# Altium footprint library mmyLibrary.PcbLib: 231 footprints (part 12 of 15)
Each footprint in its own frame and in the unit in brackets; x right, y up, seen from the top. Pads: shape width x height; smd on the part's side, far side on the other; paste and mask are expansions set on the pad; w line width, h text height; cw(c..) or ccw(c..) is an arc to the next point about the centre after c.
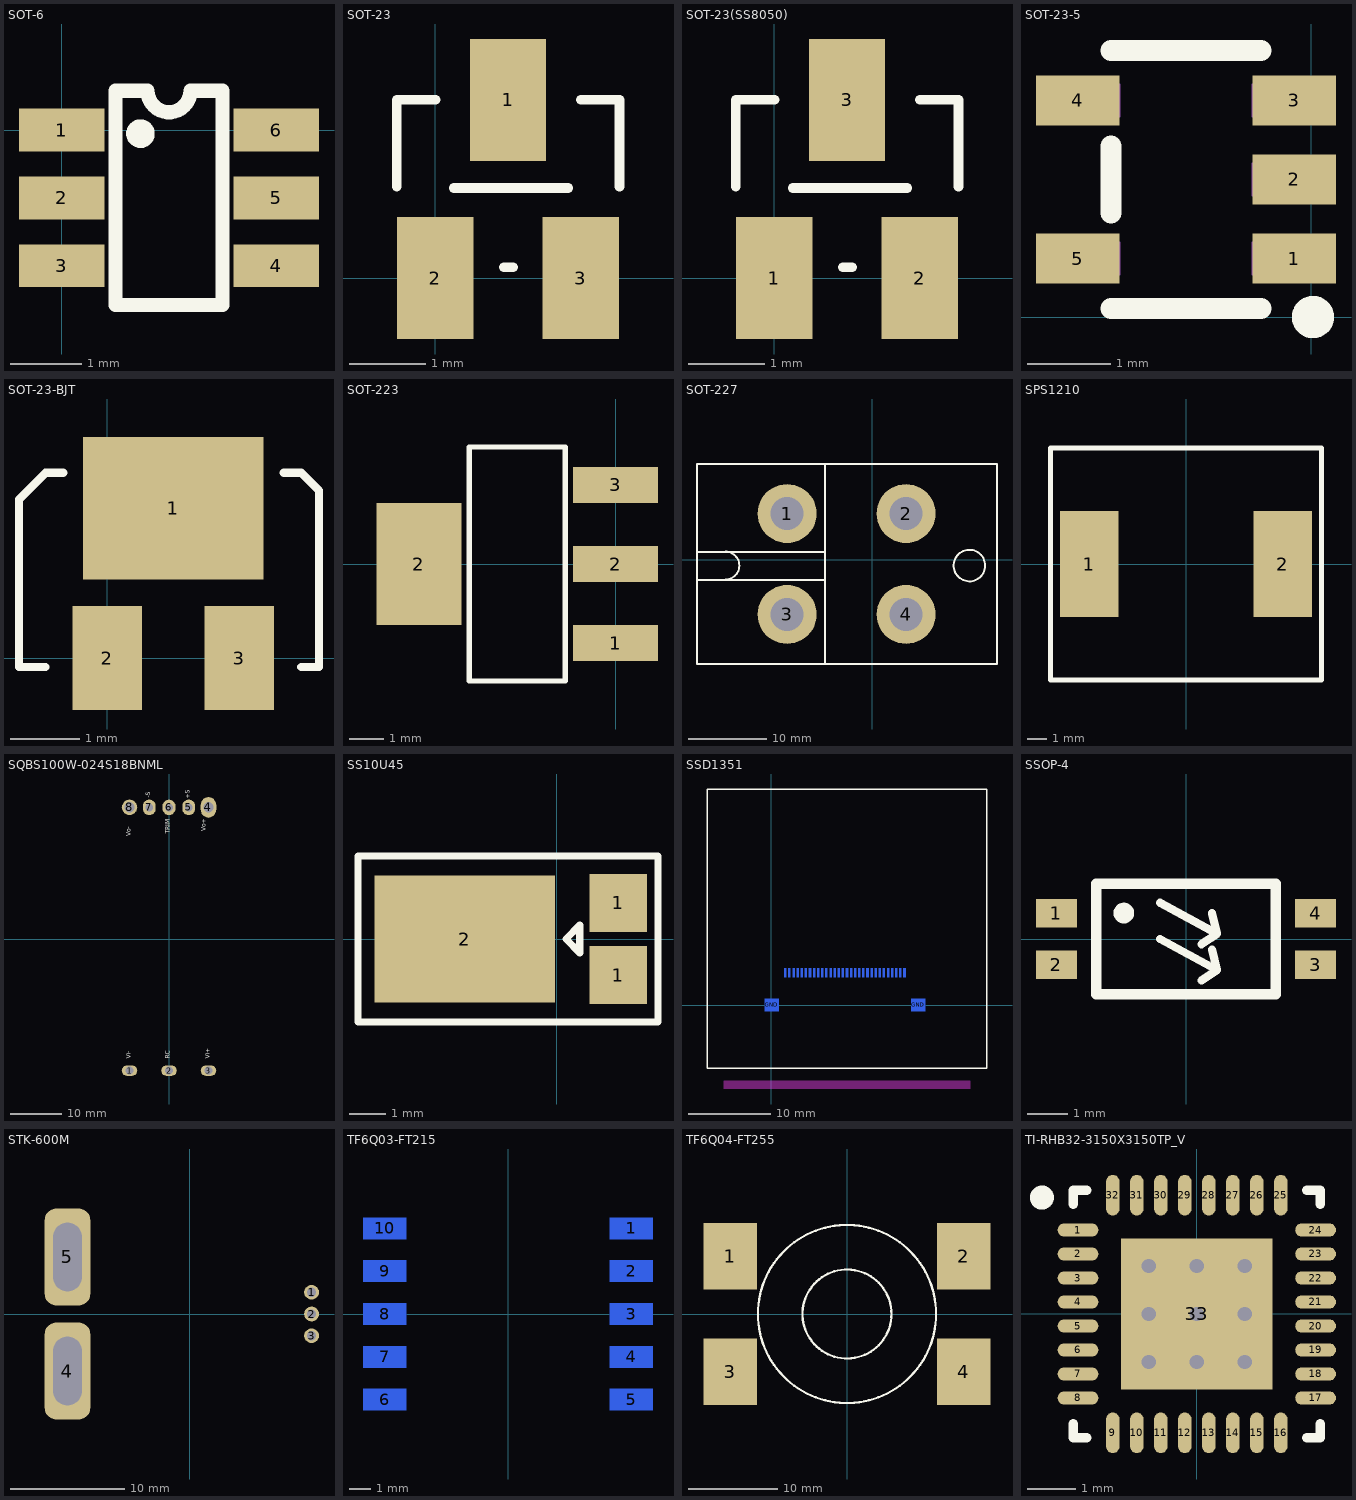
[diagram p11: the footprints below, top view; thin cyan lines are the x and y axes]

## SOT-6 [mm]
pads (6):
  rect 1.2x0.6 smd: 1(0,0) 2(0,-0.95) 3(0,-1.9) 4(3,-1.9) 5(3,-0.95) 6(3,0)
Top Overlay:
  circle w0.2: c1.1,-0.05 r0.1
  lines w0.2: 0.75,-2.45 0.75,0.55 1.2,0.55 ccw(c1.5,0.55) 1.8,0.55 2.25,0.55 2.25,-2.45 0.75,-2.45

## SOT-23 [mm] "MMSS8050"
pads (3):
  rect 1x1.6 smd: 1(0.955,2.335) 2(0,0) 3(1.91,0)
Top Overlay:
  lines w0.127: -0.503,1.196 -0.503,2.339 0.005,2.339 ; 0.245,1.18 1.745,1.18 ; 0.898,0.14 1.025,0.14 ; 1.91,2.339 2.418,2.339 2.418,1.196
3D body "ALSRobot-SOT23.STEP": height 1.08, standoff 0, extent -0.582,-0.124 2.418,2.516

## SOT-23(SS8050) [mm]
pads (3):
  rect 1x1.6 smd: 1(0,0) 2(1.91,0) 3(0.955,2.335)
Top Overlay:
  lines w0.127: -0.503,1.196 -0.503,2.339 0.005,2.339 ; 0.245,1.18 1.745,1.18 ; 0.898,0.14 1.025,0.14 ; 1.91,2.339 2.418,2.339 2.418,1.196
3D body "ALSRobot-SOT23.STEP": height 1.08, standoff 0, extent -0.505,-0.14 2.495,2.5

## SOT-23-5 [mm]
pads (5):
  rect 1x0.6 smd mask+0.051: 1(-0.202,0.701) 2(-0.202,1.651) 3(-0.202,2.601) 4(-2.802,2.601) 5(-2.802,0.701)
Top Overlay:
  circle w0.254: c0.022,0 r0.127
  lines w0.254: -2.402,0.101 -0.602,0.101 ; -2.402,1.251 -2.402,2.051 ; -2.402,3.201 -0.602,3.201
Mechanical 15:
  region: -0.712,0.501 -0.712,0.901 -0.542,0.901 -0.542,0.501
  region: -0.552,0.501 -0.552,0.901 -0.102,0.901 -0.102,0.501
  region: -0.712,1.451 -0.712,1.851 -0.542,1.851 -0.542,1.451
  region: -0.552,1.451 -0.552,1.851 -0.102,1.851 -0.102,1.451
  region: -0.712,2.401 -0.712,2.801 -0.542,2.801 -0.542,2.401
  region: -0.552,2.401 -0.552,2.801 -0.102,2.801 -0.102,2.401
  region: -2.462,2.401 -2.462,2.801 -2.292,2.801 -2.292,2.401
  region: -2.902,2.401 -2.902,2.801 -2.452,2.801 -2.452,2.401
  region: -2.462,0.501 -2.462,0.901 -2.292,0.901 -2.292,0.501
  region: -2.902,0.501 -2.902,0.901 -2.452,0.901 -2.452,0.501
  lines w0.051: -2.302,0.201 -0.702,0.201 ; -2.302,3.101 -0.702,3.101
3D body "CircuitWorks-SOT-23-5.STEP": height 1.15, standoff 0.05, extent -2.774,0.151 -0.274,3.151

## SOT-23-BJT [mm]
pads (3):
  rect 2.6x2.05 smd: 1(0.95,2.159)
  rect 1x1.5 smd: 2(0,0) 3(1.9,0)
Top Overlay:
  lines w0.12: -0.889,-0.127 -1.27,-0.127 -1.27,2.286 -0.889,2.667 -0.635,2.667 ; 2.54,2.667 2.794,2.667 3.048,2.413 3.048,-0.127 2.794,-0.127

## SOT-223 [mm]
pads (4):
  rect 2.465x1.05 smd: 1(0,-2.3) 2(0,0) 3(0,2.3)
  rect 2.465x3.54 smd: 2(-5.715,0)
Top Overlay:
  lines w0.152: -4.254,-3.401 -4.254,3.401 -1.461,3.401 -1.461,-3.401 -4.254,-3.401
3D body "CircuitWorks-SOT-223.STEP": height 1.8, standoff 0.12, extent -6.274,-3.25 0.686,3.25

## SOT-227 [mm]
pads (4):
  round 7.5 hole 4.2: 1(-10.785,5.871) 2(4.315,5.871) 3(-10.785,-6.929) 4(4.315,-6.929)
Top Overlay:
  circle w0.254: c12.365,-0.729 r2
  lines w0.254: -22.235,-2.561 -5.979,-2.561 ; -22.235,0.995 -5.979,0.995 ; -18.635,-2.507 ccw(c-18.635,-0.729) -18.635,1.049 ; -5.979,-13.211 -5.979,-2.561 ; -5.979,12.153 -5.979,0.995 ; -5.979,-2.561 -5.979,0.995 ; -22.235,-13.229 15.865,-13.229 15.865,12.171 -22.235,12.171 -22.235,-13.229

## SPS1210 [mm]
pads (2):
  rect 3x5.5 smd: 1(-5,0) 2(5,0)
Top Overlay:
  lines w0.254: -7,-6 -7,6 7,6 7,-6 -7,-6

## SQBS100W-024S18BNML [mm] "57.9mm 36.8mm"
pads (8):
  oval 3x2 hole 1.5: 1(-7.62,-25.4) 2(0,-25.4) 3(7.62,-25.4)
  oval 3x4 hole 2: 4(7.62,25.4)
  oval 2.5x3 hole 1.5: 5(3.81,25.4) 6(0,25.4) 7(-3.81,25.4)
  round 3 hole 2: 8(-7.62,25.4)
Top Overlay:
  text "TRIM" at 0.469,20.306 h1.5
  text "-S" at -3.331,27.214 h1.5
  text "+S" at 4.269,27.058 h1.5
  text "Vo+" at 7.369,20.753 h1.5
  text "Vo-" at -7.12,19.806 h1.5
  text "Vi-" at -7.12,-23.1 h1.5
  text "RC" at 0.48,-23.101 h1.5
  text "Vi+" at 8.18,-23.1 h1.5
Bottom Overlay:
  circle w0.2: c-13.08,-23.6 r1.6
  circle w0.2: c13.08,-23.6 r1.6
  circle w0.2: c13.08,23.6 r1.6
  circle w0.2: c-13.08,23.6 r1.6
  lines w0.2: -18.4,-28.95 18.4,-28.95 18.4,28.95 -18.4,28.95 -18.4,-28.95
  text "Vi+" at 8.18,-21.205 h1.5
  text "RC" at 0.48,-21.322 h1.5
  text "Vi-" at -7.12,-21.51 h1.5
  text "Vo-" at -7.12,21.844 h1.5
  text "Vo+" at 8.18,21.844 h1.5
  text "+S" at 4.18,21.846 h1.5
  text "-S" at -3.32,21.846 h1.5
  text "TRIM" at 0.496,21.846 h1.5

## SS10U45 [mm] "diode"
pads (3):
  rect 1.6x1.6 smd: 1(1.7,-1) 1(1.7,1)
  rect 5x3.5 smd: 2(-2.55,0)
Top Overlay:
  lines w0.2: -5.5,-2.3 2.8,-2.3 2.8,2.3 -5.5,2.3 -5.5,-2.3 ; 0.254,0 0.635,-0.381 0.635,0.381 0.254,0

## SSD1351 [mm]
pads (32):
  rect 0.25x1.1 smd far side: CLK(8.225,3.937) CS(10.724,3.937) DC(11.224,3.937) DIN(7.724,3.937) GND(1.727,3.934) GND(4.724,3.937) GND(5.225,3.937) GND(5.725,3.937) GND(6.224,3.937) GND(6.725,3.937) GND(8.725,3.937) GND(9.225,3.937) GND(9.724,3.937) GND(10.225,3.937) GND(15.225,3.937) GND(16.224,3.937) IREF(12.225,3.937) N.C(7.225,3.937) N.C.(4.224,3.937) N.C.(12.724,3.937) N.C.(13.225,3.937) N.C.(13.725,3.937) N.C.(15.725,3.937) RES(11.725,3.937) VCC(2.226,3.934) VCI(14.724,3.937) VCOMH(2.724,3.937) VDD(14.224,3.937) VDDIO(3.225,3.937) VSL(3.725,3.937)
  rect 1.7x1.5 smd far side: GND(0.075,0.036) GND(17.876,0.036)
Top Overlay:
  lines w0.16: -7.772,-7.695 -7.772,26.305 26.228,26.305 26.228,-7.695 -7.772,-7.695
Bottom Overlay:
  circle w0.16: c0.727,4.805 r0.22
  lines w0.254: 1.476,3.486 0.475,3.486 0.475,1.985 1.976,1.985 ; 15.986,1.985 17.485,1.985 17.485,3.486 16.484,3.486 ; -0.274,-1.214 -0.274,3.986 18.226,3.986 18.226,-1.214 -0.274,-1.214
  text "30" at 18.562,4.393 h2.03
Keep-Out Layer:
  board cut-out: -5.773,-9.196 -5.773,-10.196 24.227,-10.196 24.227,-9.196

## SSOP-4 [mm]
pads (4):
  rect 1x0.7 smd: 1(-3.175,0.635) 2(-3.175,-0.635) 3(3.175,-0.635) 4(3.175,0.635)
Top Overlay:
  circle w0.254: c-1.524,0.635 r0.127
  lines w0.2: -0.635,0 0.762,-0.762 ; -0.635,0.889 0.762,0.127 ; 0.381,-1.016 0.762,-0.762 ; 0.381,-0.127 0.762,0.127 ; 0.635,-0.254 0.762,-0.762 ; 0.635,0.635 0.762,0.127
  lines w0.254: -2.2,-1.35 -2.2,1.35 2.2,1.35 2.2,-1.35 -2.2,-1.35

## STK-600M [mm]
pads (5):
  round 1.3 hole 0.8: 1(10.7,1.905) 2(10.7,0) 3(10.7,-1.905)
  rrect50% 4x8.5 hole 2.5 slot 6 at 90 deg: 4(-10.7,-5) 5(-10.7,5)
Bottom Overlay:
  lines w0.2: -9.296,-8.788 -8.588,-8.788 -5.8,-6 ; -9.296,8.788 -8.588,8.788 -5.8,6 ; 4.95,-6 4.95,6 ; -5.8,-6 7.7,-6 7.7,6 -5.8,6 ; -5.8,-6 -5.8,6
  text "Vc" at 9.659,1.753 h0.8
  text "IP-" at -6.47,4.445 h0.8
  text "IP+" at -6.394,-5.309 h0.8
  text "GND" at 8.77,-0.991 h0.8
  text "Vo" at 9.633,-2.464 h0.8

## TF6Q03-FT215 [mm]
pads (10):
  rect 2x1 smd far side: 1(5.75,4) 2(5.75,2) 3(5.75,0) 4(5.75,-2) 5(5.75,-4) 6(-5.75,-4) 7(-5.75,-2) 8(-5.75,0) 9(-5.75,2) 10(-5.75,4)
Bottom Overlay:
  lines w0.178: 5.92,5.74 6.94,4.84 ; -7,-5.75 7,-5.75 7,5.75 -7,5.75 -7,-5.75
  text "1" at 8.33,4.24 h1
  text "3" at 8.35,0.33 h1
  text "2" at 8.32,2.29 h1
  text "4" at 8.37,-1.62 h1
  text "5" at 8.42,-3.74 h1
  text "9" at -7.32,2.21 h1
  text "7" at -7.21,-1.97 h1
  text "8" at -7.3,0.2 h1
  text "10" at -7.32,4.62 h1
  text "6" at -7.27,-3.77 h1

## TF6Q04-FT255 [mm]
pads (4):
  rect 6x7.5 smd: 1(-13.1,6.5) 2(13.1,6.5) 3(-13.1,-6.5) 4(13.1,-6.5)
Top Overlay:
  circle w0.254: c0,0 r5
  circle w0.254: c0,0 r10

## TI-RHB32-3150X3150TP_V [mm]
pads (33):
  oval 0.85x0.28 smd: 1(-2.475,1.75) 2(-2.475,1.25) 3(-2.475,0.75) 4(-2.475,0.25) 5(-2.475,-0.25) 6(-2.475,-0.75) 7(-2.475,-1.25) 8(-2.475,-1.75) 17(2.475,-1.75) 18(2.475,-1.25) 19(2.475,-0.75) 20(2.475,-0.25) 21(2.475,0.25) 22(2.475,0.75) 23(2.475,1.25) 24(2.475,1.75)
  oval 0.28x0.85 smd: 9(-1.75,-2.475) 10(-1.25,-2.475) 11(-0.75,-2.475) 12(-0.25,-2.475) 13(0.25,-2.475) 14(0.75,-2.475) 15(1.25,-2.475) 16(1.75,-2.475) 25(1.75,2.475) 26(1.25,2.475) 27(0.75,2.475) 28(0.25,2.475) 29(-0.25,2.475) 30(-0.75,2.475) 31(-1.25,2.475) 32(-1.75,2.475)
  rect 3.15x3.15 smd: 33(0,0)
via -1,1 diameter 0.5 hole 0.3
via 0,1 diameter 0.5 hole 0.3
via 1,1 diameter 0.5 hole 0.3
via -1,0 diameter 0.5 hole 0.3
via 0,0 diameter 0.5 hole 0.3
via 1,0 diameter 0.5 hole 0.3
via -1,-1 diameter 0.5 hole 0.3
via 0,-1 diameter 0.5 hole 0.3
via 1,-1 diameter 0.5 hole 0.3
Top Overlay:
  circle w0.25: c-3.225,2.425 r0.125
  lines w0.2: -2.575,-2.29 -2.575,-2.575 -2.29,-2.575 ; -2.575,2.29 -2.575,2.575 -2.29,2.575 ; 2.29,-2.575 2.575,-2.575 2.575,-2.29 ; 2.29,2.575 2.575,2.575 2.575,2.29
Mechanical 15:
  lines w0.1: -0.5,0 0.5,0 ; 0,-0.5 0,0.5